# Altium footprint library X2安规电容.PcbLib: 22 footprints (part 1 of 2)
Each footprint in its own frame and in the unit in brackets; x right, y up, seen from the top. Pads: shape width x height; smd on the part's side, far side on the other; paste and mask are expansions set on the pad; w line width, h text height; cw(c..) or ccw(c..) is an arc to the next point about the centre after c.
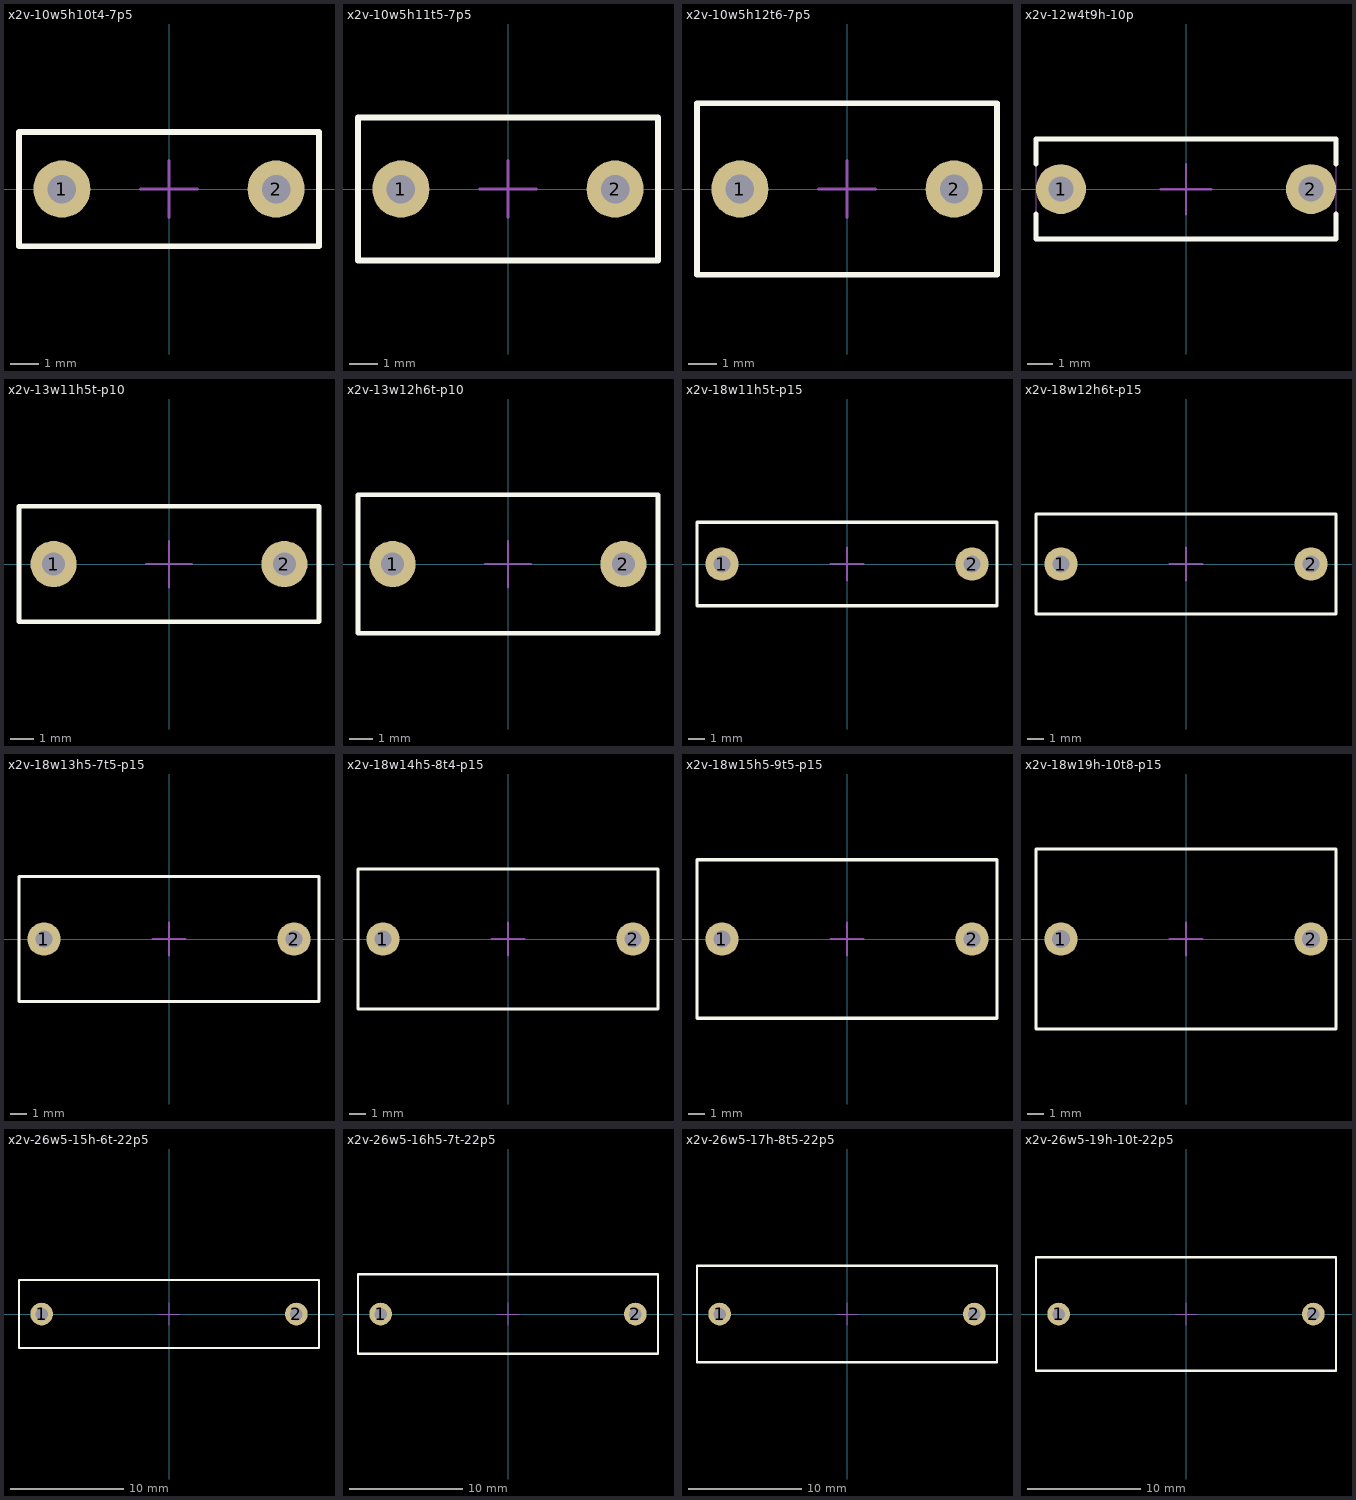
[diagram p0: the footprints below, top view; thin cyan lines are the x and y axes]

## x2v-10w5h10t4-7p5 [mm]
height 10
pads (2):
  round 2 hole 1: 1(-3.75,0) 2(3.75,0)
Top Overlay:
  lines w0.2: -5.25,-2 5.25,-2 5.25,2 -5.25,2 -5.25,-2
Mechanical 13:
  lines w0.05: -5.25,-2 -5.25,2.005 5.25,2.005 5.25,-2 -5.25,-2
Mechanical 15:
  lines w0.1: -1,0 1,0 ; 0,-1 0,1
3D body: height 10.05, standoff -3.95, extent -5.25,-2 5.25,2.005

## x2v-10w5h11t5-7p5 [mm]
height 11
pads (2):
  round 2 hole 1: 1(-3.75,0) 2(3.75,0)
Top Overlay:
  lines w0.2: -5.25,-2.5 -5.25,2.505 5.25,2.505 5.25,-2.5 -5.25,-2.5
Mechanical 13:
  lines w0.05: -5.25,-2.5 5.25,-2.5 5.25,2.505 -5.25,2.505 -5.25,-2.5
Mechanical 15:
  lines w0.1: -1,0 1,0 ; 0,-1 0,1
3D body: height 11.01, standoff -3.99, extent -5.25,-2.5 5.25,2.505

## x2v-10w5h12t6-7p5 [mm]
height 12
pads (2):
  round 2 hole 1: 1(-3.75,0) 2(3.75,0)
Top Overlay:
  lines w0.2: -5.25,-3.002 5.25,-3.002 5.25,3.003 -5.25,3.003 -5.25,-3.002
Mechanical 13:
  lines w0.05: -5.25,-3.002 -5.25,3.003 5.25,3.003 5.25,-3.002 -5.25,-3.002
Mechanical 15:
  lines w0.1: -1,0 1,0 ; 0,-1 0,1
3D body: height 12.01, standoff -3.99, extent -5.25,-3.002 5.25,3.003

## x2v-12w4t9h-10p [mm]
height 9
pads (2):
  round 2 hole 1: 1(-5,0) 2(5,0)
Top Overlay:
  lines w0.2: -6,-0.999 -6,-2 6,-2 6,-0.999 ; -6,1.004 -6,2.005 6,2.005 6,1.004
Mechanical 13:
  lines w0.05: -6,-2 6,-2 6,2.005 -6,2.005 -6,-2
Mechanical 15:
  lines w0.1: -1,0 1,0 ; 0,-1 0,1
3D body: height 9.01, standoff -3.99, extent -6,-2 6,2.005

## x2v-13w11h5t-p10 [mm]
height 11
pads (2):
  round 2 hole 1: 1(-5,0) 2(5,0)
Top Overlay:
  lines w0.2: -6.5,-2.5 6.5,-2.5 6.5,2.505 -6.5,2.505 -6.5,-2.5
Mechanical 13:
  lines w0.05: -6.5,-2.5 6.5,-2.5 6.5,2.505 -6.5,2.505 -6.5,-2.5
Mechanical 15:
  lines w0.1: -1,0 1,0 ; 0,-1 0,1
3D body: height 11.01, standoff -3.99, extent -6.5,-2.5 6.5,2.505

## x2v-13w12h6t-p10 [mm]
height 12
pads (2):
  round 2 hole 1: 1(-5,0) 2(5,0)
Top Overlay:
  lines w0.2: -6.5,-3 6.5,-3 6.5,3.005 -6.5,3.005 -6.5,-3
Mechanical 13:
  lines w0.05: -6.5,-3 6.5,-3 6.5,3.005 -6.5,3.005 -6.5,-3
Mechanical 15:
  lines w0.1: -1,0 1,0 ; 0,-1 0,1
3D body: height 12.01, standoff -3.99, extent -6.5,-3 6.5,3.005

## x2v-18w11h5t-p15 [mm]
height 11
pads (2):
  round 2 hole 1: 1(-7.5,0) 2(7.5,0)
Top Overlay:
  lines w0.2: -9,-2.5 9,-2.5 9,2.505 -9,2.505 -9,-2.5
Mechanical 13:
  lines w0.05: -9,-2.5 9,-2.5 9,2.505 -9,2.505 -9,-2.5
Mechanical 15:
  lines w0.1: -1,0 1,0 ; 0,-1 0,1
3D body: height 11.01, standoff -3.99, extent -9,-2.5 9,2.505

## x2v-18w12h6t-p15 [mm]
height 12
pads (2):
  round 2 hole 1: 1(-7.5,0) 2(7.5,0)
Top Overlay:
  lines w0.2: -9,-3 -9,3.005 9,3.005 9,-3 -9,-3
Mechanical 13:
  lines w0.05: -9,-3 -9,3.005 9,3.005 9,-3 -9,-3
Mechanical 15:
  lines w0.1: -1,0 1,0 ; 0,-1 0,1
3D body: height 12.01, standoff -3.99, extent -9,-3 9,3.005

## x2v-18w13h5-7t5-p15 [mm]
height 13.5
pads (2):
  round 2 hole 1: 1(-7.5,0) 2(7.5,0)
Top Overlay:
  lines w0.2: -9,-3.75 -9,3.755 9,3.755 9,-3.75 -9,-3.75
Mechanical 13:
  lines w0.05: -9,-3.75 -9,3.755 9,3.755 9,-3.75 -9,-3.75
Mechanical 15:
  lines w0.1: -1,0 1,0 ; 0,-1 0,1
3D body: height 13.51, standoff -3.99, extent -9,-3.75 9,3.755

## x2v-18w14h5-8t4-p15 [mm]
height 14.5
pads (2):
  round 2 hole 1: 1(-7.5,0) 2(7.5,0)
Top Overlay:
  lines w0.2: -9,-4.2 -9,4.205 9,4.205 9,-4.2 -9,-4.2
Mechanical 13:
  lines w0.05: -9,-4.2 -9,4.205 9,4.205 9,-4.2 -9,-4.2
Mechanical 15:
  lines w0.1: -1,0 1,0 ; 0,-1 0,1
3D body: height 14.51, standoff -3.99, extent -9,-4.2 9,4.205

## x2v-18w15h5-9t5-p15 [mm]
height 15.5
pads (2):
  round 2 hole 1: 1(-7.5,0) 2(7.5,0)
Top Overlay:
  lines w0.2: -9,-4.75 -9,4.755 9,4.755 9,-4.75 -9,-4.75
Mechanical 13:
  lines w0.05: -9,-4.75 -9,4.755 9,4.755 9,-4.75 -9,-4.75
Mechanical 15:
  lines w0.1: -1,0 1,0 ; 0,-1 0,1
3D body: height 15.51, standoff -3.99, extent -9,-4.75 9,4.755

## x2v-18w19h-10t8-p15 [mm]
height 19
pads (2):
  round 2 hole 1.1: 1(-7.5,0) 2(7.5,0)
Top Overlay:
  lines w0.2: -9,-5.4 -9,5.405 9,5.405 9,-5.4 -9,-5.4
Mechanical 13:
  lines w0.05: -9,-5.4 -9,5.405 9,5.405 9,-5.4 -9,-5.4
Mechanical 15:
  lines w0.1: -1,0 1,0 ; 0,-1 0,1
3D body: height 19.01, standoff -3.99, extent -9,-5.4 9,5.405

## x2v-26w5-15h-6t-22p5 [mm]
height 15
pads (2):
  round 2 hole 1.1: 1(-11.25,0) 2(11.25,0)
Top Overlay:
  lines w0.2: -13.25,-3 13.25,-3 13.25,3.005 -13.25,3.005 -13.25,-3
Mechanical 13:
  lines w0.05: -13.25,-3 13.25,-3 13.25,3.005 -13.25,3.005 -13.25,-3
Mechanical 15:
  lines w0.1: -1,0 1,0 ; 0,-1 0,1
3D body: height 15.01, standoff -3.99, extent -13.25,-3 13.25,3.005

## x2v-26w5-16h5-7t-22p5 [mm]
height 16.5
pads (2):
  round 2 hole 1.1: 1(-11.25,0) 2(11.25,0)
Top Overlay:
  lines w0.2: -13.25,-3.5 13.25,-3.5 13.25,3.505 -13.25,3.505 -13.25,-3.5
Mechanical 13:
  lines w0.05: -13.25,-3.5 13.25,-3.5 13.25,3.505 -13.25,3.505 -13.25,-3.5
Mechanical 15:
  lines w0.1: -1,0 1,0 ; 0,-1 0,1
3D body: height 16.51, standoff -3.99, extent -13.25,-3.5 13.25,3.505

## x2v-26w5-17h-8t5-22p5 [mm]
height 17
pads (2):
  round 2 hole 1.1: 1(-11.25,0) 2(11.25,0)
Top Overlay:
  lines w0.2: -13.25,-4.25 13.25,-4.25 13.25,4.255 -13.25,4.255 -13.25,-4.25
Mechanical 13:
  lines w0.05: -13.25,-4.25 13.25,-4.25 13.25,4.255 -13.25,4.255 -13.25,-4.25
Mechanical 15:
  lines w0.1: -1,0 1,0 ; 0,-1 0,1
3D body: height 17.01, standoff -3.99, extent -13.25,-4.25 13.25,4.255

## x2v-26w5-19h-10t-22p5 [mm]
height 19
pads (2):
  round 2 hole 1.1: 1(-11.25,0) 2(11.25,0)
Top Overlay:
  lines w0.2: -13.25,-5 13.25,-5 13.25,5.005 -13.25,5.005 -13.25,-5
Mechanical 13:
  lines w0.05: -13.25,-5 13.25,-5 13.25,5.005 -13.25,5.005 -13.25,-5
Mechanical 15:
  lines w0.1: -1,0 1,0 ; 0,-1 0,1
3D body: height 19.01, standoff -3.99, extent -13.25,-5 13.25,5.005